# Altium footprint library BARKO_PCBLIB.PcbLib: 531 footprints (part 32 of 34)
Each footprint in its own frame and in the unit in brackets; x right, y up, seen from the top. Pads: shape width x height; smd on the part's side, far side on the other; paste and mask are expansions set on the pad; w line width, h text height; cw(c..) or ccw(c..) is an arc to the next point about the centre after c.
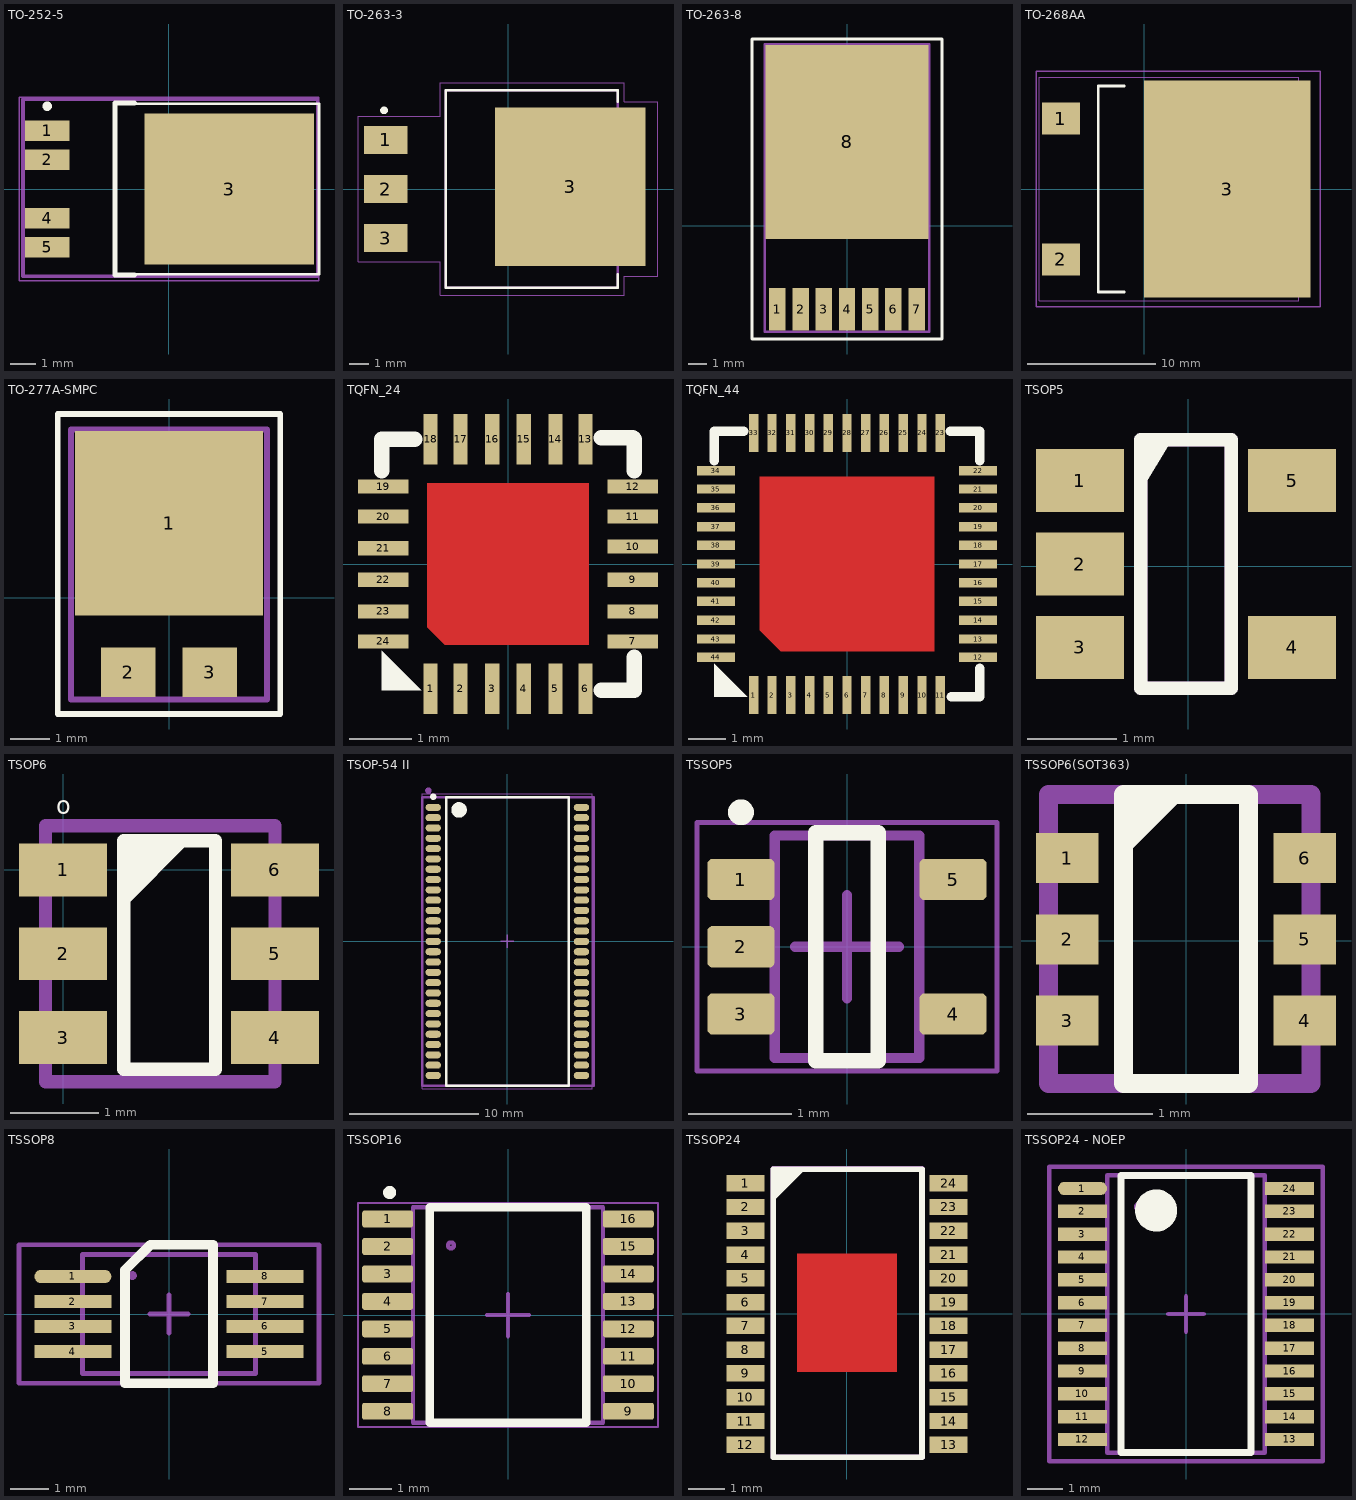
[diagram p31: the footprints below, top view; thin cyan lines are the x and y axes]

## TO-252-5 [mm] "DPAK, 5-Leads, Body 6.5x6.12mm, Pitch 1.14mm, IPC Medium Density"
height 2.35
pads (5):
  rect 1.75x0.8 smd: 1(-4.75,2.28) 2(-4.75,1.14) 4(-4.75,-1.14) 5(-4.75,-2.28)
  rect 6.6x5.9 smd: 3(2.35,0)
Top Overlay:
  circle w0.25: c-4.75,3.23 r0.058
  lines w0.1: -2.1,-3.325 5.85,-3.325 5.85,3.325 -2.1,3.325 -2.1,-3.325
  lines w0.2: -1.35,-3.35 -2.1,-3.35 -2.1,3.35 -1.35,3.35
Mechanical 15:
  lines w0.05: -5.85,-3.575 5.85,-3.575 5.85,3.575 -5.85,3.575 -5.85,-3.575
  lines w0.1: -0.5,0 0.5,0 ; 0,-0.5 0,0.5
ASM Top:
  lines w0.15: -5.7,-3.4 -5.7,3.5 5.8,3.5 5.8,-3.4 -5.7,-3.4
  text ".designator" at -0.6,-0.1 h1.2
3D body "User Library-PG-TO252-5-11-1.STEP": height 2.3, standoff 0, extent -4.8,-3.25 5.1,3.25

## TO-263-3 [mm]
pads (4):
  rect 2.25x1.44 smd: 1(-6.31,2.54) 2(-6.31,0) 3(-6.31,-2.54)
  rect 7.79x8.19 smd paste-10: 3(3.213,0.127)
Top Overlay:
  circle w0.2: c-6.402,4.064 r0.1
  lines w0.127: 5.664,-4.4 5.664,-5.112 -3.226,-5.112 -3.226,5.112 5.664,5.112 5.664,4.5
Top Paste:
  rectangle: 4.8,-3.825 6.8,-1.35
  rectangle: 2.262,-3.825 4.262,-1.35
  rectangle: -0.275,-3.825 1.725,-1.35
  rectangle: 4.8,-1.088 6.8,1.387
  rectangle: 2.262,-1.088 4.262,1.387
  rectangle: -0.275,-1.088 1.725,1.387
  rectangle: 4.8,1.65 6.8,4.125
  rectangle: 2.262,1.65 4.262,4.125
  rectangle: -0.275,1.65 1.725,4.125
Mechanical 15:
  lines w0.05: -7.75,-3.75 -3.5,-3.75 -3.5,-5.5 6,-5.5 6,-4.5 7.75,-4.5 7.75,4.5 6,4.5 6,5.5 -3.5,5.5 -3.5,3.75 -7.75,3.75 -7.75,-3.75
ASM Top:
  lines w0.127: -3.226,-5.112 5.664,-5.112 5.664,5.112 -3.226,5.112 -3.226,-5.112
  text ".designator" at -0.175,-0.375 h1.2
3D body "User Library-D²PAK TO-263-3.STEP": height 4.87, standoff 0, extent -7.116,-5.08 7.114,5.08

## TO-263-8 [mm]
pads (8):
  rect 0.9x2.3 smd: 1(-3.81,-4.575) 2(-2.54,-4.575) 3(-1.27,-4.575) 4(0,-4.575) 5(1.27,-4.575) 6(2.54,-4.575) 7(3.81,-4.575)
  rect 8.9x10.6 smd: 8(0,4.575)
Top Overlay:
  lines w0.15: -5.2,-6.2 5.2,-6.2 5.2,10.2 -5.2,10.2 -5.2,10.1 -5.2,-6.2
ASM Top:
  lines w0.15: -4.5,-5.8 -4.5,9.9 4.5,9.9 4.5,-5.8 -4.5,-5.8
  text ".designator" at 0,0 h0.8
3D body "KTW7.step": height 1.77, standoff 0.01, extent -5.207,-4.623 5.207,9.4

## TO-268AA [mm] "D3-PAK, 3-Pads, Body 10.10x11.39mm (max), IPC Medium Density"
height 5.1
pads (3):
  rect 3x2.5 smd: 1(-6.5,5.5) 2(-6.5,-5.5)
  rect 13x17 smd: 3(6.5,0)
Top Overlay:
  lines w0.2: -1.55,-8.05 -3.6,-8.05 -3.6,8.05 -1.55,8.05
Mechanical 15:
  lines w0.05: -8.2,-8.75 12.1,-8.75 12.1,8.75 -8.2,8.75 -8.2,-8.75
  lines w0.1: 1.45,0 2.45,0 ; 1.95,-0.5 1.95,0.5
ASM Top:
  lines w0.1: -8.45,-9.2 13.75,-9.2 13.75,9.2 -8.45,9.2 -8.45,-9.2
  text ".designator" at -1.375,-1.925 h1.2
3D body "User Library-TO545P1905X510_HS-3.step": height 5.1, standoff 0, extent -6.95,-7.901 12.1,8.101

## TO-277A-SMPC [mil]
pads (3):
  rect 189x186 smd: 1(0,75)
  rect 55x50 smd: 2(-41,-75) 3(41,-75)
Top Overlay:
  lines w6: -112,-117 -112,185 112,185 112,-117 -112,-117
ASM Top:
  lines w6: -98.43,-102.36 -98.43,169.29 98.43,169.29 98.43,-102.36 -98.43,-102.36
  text ".designator" at -19.68,0 h31.5
3D body "TO-277A(SMPC).STEP": height 47.24, standoff -0.04, extent -94.01,-97 93,164.81

## TQFN_24 [mil]
pads (24):
  rect 9x32 smd mask+0: 1(-49,-79) 2(-30,-79) 3(-10,-79) 4(10,-79) 5(30,-79) 6(49,-79) 13(49,79) 14(30,79) 15(10,79) 16(-10,79) 17(-30,79) 18(-49,79)
  rect 32x9 smd mask+0: 7(79,-49) 8(79,-30) 9(79,-10) 10(79,11) 11(79,30) 12(79,49) 19(-79,49) 20(-79,30) 21(-79,10) 22(-79,-10) 23(-79,-30) 24(-79,-49)
Top Layer:
  region: 51,51 -51,51 -51,-40 -40,-51 51,-51
Top Overlay:
  region: -80,-55 -80,-80 -55,-80
  lines w10: -80,59 -80,79 -59,79 ; 59,-80 80,-80 80,-59 ; 59,80 79,80 80,79 80,59

## TQFN_44 [mil]
pads (44):
  rect 10x40 smd mask+0: 1(-98,-138) 2(-79,-138) 3(-59,-138) 4(-39,-138) 5(-20,-138) 6(0,-138) 7(20,-138) 8(39,-138) 9(59,-138) 10(79,-138) 11(98,-138) 23(98,138) 24(79,138) 25(59,138) 26(39,138) 27(20,138) 28(0,138) 29(-20,138) 30(-39,138) 31(-59,138) 32(-79,138) 33(-98,138)
  rect 40x10 smd mask+0: 12(138,-98) 13(138,-79) 14(138,-59) 15(138,-39) 16(138,-20) 17(138,0) 18(138,20) 19(138,39) 20(138,59) 21(138,79) 22(138,98) 34(-138,98) 35(-138,79) 36(-138,59) 37(-138,39) 38(-138,20) 39(-138,0) 40(-138,-20) 41(-138,-39) 42(-138,-59) 43(-138,-79) 44(-138,-98)
Top Layer:
  region: 92,92 -92,92 -92,-70 -70,-92 92,-92
Top Overlay:
  region: -140,-105 -140,-140 -105,-140
  lines w10: -140,109 -140,140 -109,140 ; 109,140 140,140 140,109 ; 110,-140 140,-140 140,-110

## TSOP5 [mil]
pads (5):
  rect 39x28 smd mask+2: 1(-47.95,38) 2(-47.95,1) 3(-47.95,-36) 4(46.05,-36) 5(46.05,38)
Top Overlay:
  region: -7.37,56 -20.95,56 -20.95,33.36
  lines w6: -20.95,-54 19.05,-54 19.05,56 -20.95,56 -20.95,-54
ASM Top:
  lines w6: -20.95,-54 -20.95,56 19.05,56 19.05,-54 -20.95,-54
  text ".designator" at -27.56,-11.81 h31.5
3D body "5-TSOP.STEP": height 43.31, standoff 0, extent -59.06,-61.03 59.05,61.02

## TSOP6 [mm]
pads (6):
  rect 1x0.6 smd: 1(0,0) 2(0,-0.95) 3(0,-1.9) 4(2.4,-1.9) 5(2.4,-0.95) 6(2.4,0)
Top Overlay:
  region: 0.686,0.33 0.686,-0.432 1.448,0.33
  lines w0.152: 0.686,-2.261 1.727,-2.261 1.727,0.33 0.686,0.33 0.686,-2.261
  text "o" at -0.076,0.635 h0.2
ASM Top:
  lines w0.15: -0.2,-2.4 2.4,-2.4 2.4,0.5 -0.2,0.5 -0.2,-2.4
  text ".designator" at 0.8,-0.8 h1.5
3D body "TSOP6.STEP": height 1.01, standoff -0.04, extent -0.232,-2.465 2.518,0.535

## TSOP-54 II [mm] "TSOP, 54-Leads, Body 22.22x10.16mm, Pitch 0.80mm, IPC Medium Density"
height 1.2
pads (54):
  oval 1.2x0.55 smd mask+0.05: 1(-5.75,10.4) 2(-5.75,9.6) 3(-5.75,8.8) 4(-5.75,8) 5(-5.75,7.2) 6(-5.75,6.4) 7(-5.75,5.6) 8(-5.75,4.8) 9(-5.75,4) 10(-5.75,3.2) 11(-5.75,2.4) 12(-5.75,1.6) 13(-5.75,0.8) 14(-5.75,0) 15(-5.75,-0.8) 16(-5.75,-1.6) 17(-5.75,-2.4) 18(-5.75,-3.2) 19(-5.75,-4) 20(-5.75,-4.8) 21(-5.75,-5.6) 22(-5.75,-6.4) 23(-5.75,-7.2) 24(-5.75,-8) 25(-5.75,-8.8) 26(-5.75,-9.6) 27(-5.75,-10.4) 28(5.75,-10.4) 29(5.75,-9.6) 30(5.75,-8.8) 31(5.75,-8) 32(5.75,-7.2) 33(5.75,-6.4) 34(5.75,-5.6) 35(5.75,-4.8) 36(5.75,-4) 37(5.75,-3.2) 38(5.75,-2.4) 39(5.75,-1.6) 40(5.75,-0.8) 41(5.75,0) 42(5.75,0.8) 43(5.75,1.6) 44(5.75,2.4) 45(5.75,3.2) 46(5.75,4) 47(5.75,4.8) 48(5.75,5.6) 49(5.75,6.4) 50(5.75,7.2) 51(5.75,8) 52(5.75,8.8) 53(5.75,9.6) 54(5.75,10.4)
Top Overlay:
  circle w0.6: c-3.75,10.2 r0.3
  circle w0.25: c-5.75,11.225 r0.125
  lines w0.2: -4.75,-11.2 4.75,-11.2 4.75,11.2 -4.75,11.2 -4.75,-11.2
Mechanical 15:
  lines w0.05: -6.6,-11.45 6.6,-11.45 6.6,11.45 -6.6,11.45 -6.6,-11.45
  lines w0.1: -0.5,0 0.5,0 ; 0,-0.5 0,0.5
ASM Top:
  circle w0.25: c-6.125,11.7 r0.125
  circle w0.2: c-3.75,10.2 r0.112
  lines w0.2: -6.6,-11.2 -6.6,11.2 6.7,11.2 6.7,-11.2 -6.6,-11.2
  text ".designator" at 0,0 h0.8
3D body "User Library-TSOP-54-1.step": height 1.25, standoff 0, extent -5.88,-11.11 5.88,11.11

## TSSOP5 [mm] "SOT23, 5-Leads, Body 2.15x1.4mm, Pitch 0.65mm, IPC High Density"
height 1.1
pads (5):
  rrect25% 0.65x0.4 smd mask+0.051: 1(-1.025,0.65) 2(-1.025,0) 3(-1.025,-0.65) 4(1.025,-0.65) 5(1.025,0.65)
Top Overlay:
  circle w0.15: c-1.025,1.3 r0.05
  lines w0.15: -0.3,-1.1 -0.3,1.1 0.3,1.1 0.3,-1.1 -0.3,-1.1
Mechanical 15:
  lines w0.05: -1.45,-1.2 1.45,-1.2 1.45,1.2 -1.45,1.2 -1.45,-1.2
  lines w0.1: -0.5,0 0.5,0 ; 0,-0.5 0,0.5
ASM Top:
  lines w0.1: -0.7,-1.075 -0.7,1.075 0.7,1.075 0.7,-1.075 -0.7,-1.075
  text ".designator" at -0.4,-0.1 h0.8
3D body "DCK0005AakaMAA05A.stp": height 0.94, standoff -0.01, extent -1.14,-1 1.14,1

## TSSOP6(SOT363) [mm]
pads (6):
  rect 0.5x0.4 smd mask+0.05: 1(-0.95,0.659) 2(-0.95,0.009) 3(-0.95,-0.641) 4(0.95,-0.641) 5(0.95,0.009) 6(0.95,0.659)
Top Overlay:
  region: -0.465,1.168 -0.465,0.7 0.003,1.168
  lines w0.152: -0.5,-1.143 -0.5,1.168 0.5,1.168 0.5,-1.143 -0.5,-1.143
ASM Top:
  lines w0.15: -1.1,-1.143 1,-1.143 1,1.168 -1.1,1.168 -1.1,-1.143
  text ".designator" at -0.051,-0.457 h0.8
3D body "TSSOP6.STEP": height 1.11, standoff 0.01, extent -1.1,-0.991 1.1,1.009

## TSSOP8 [mm]
height 1.2
pads (8):
  oval 2x0.35 smd: 1(-2.5,0.975)
  rect 2x0.35 smd: 2(-2.5,0.325) 3(-2.5,-0.325) 4(-2.5,-0.975) 5(2.5,-0.975) 6(2.5,-0.325) 7(2.5,0.325) 8(2.5,0.975)
Top Overlay:
  lines w0.254: -1.143,-1.8 -1.143,1.143 -0.486,1.8 1.143,1.8 1.143,-1.8 -1.143,-1.8
Mechanical 15:
  lines w0.127: -0.5,0 0.5,0 ; 0,-0.5 0,0.5 ; -3.9,-1.8 3.9,-1.8 3.9,1.8 -3.9,1.8 -3.9,-1.8
ASM Top:
  circle w0.127: c-0.95,1 r0.05
  lines w0.127: -1.55,-1.55 1.55,-1.55 ; -1.55,1.55 1.55,1.55 ; -2.25,-1.55 -2.25,1.55 2.25,1.55 2.25,-1.55 -2.25,-1.55
  text ".designator" at -0.5,-0.2 h0.8
3D body "TSSOP8.step": height 1.2, standoff 0, extent -3.2,-1.55 3.2,1.55

## TSSOP16 [mm]
pads (16):
  rrect25% 1.2x0.4 smd mask+0.05: 1(-2.85,2.275) 2(-2.85,1.625) 3(-2.85,0.975) 4(-2.85,0.325) 5(-2.85,-0.325) 6(-2.85,-0.975) 7(-2.85,-1.625) 8(-2.85,-2.275) 9(2.85,-2.275) 10(2.85,-1.625) 11(2.85,-0.975) 12(2.85,-0.325) 13(2.85,0.325) 14(2.85,0.975) 15(2.85,1.625) 16(2.85,2.275)
Top Overlay:
  lines w0.2: -1.85,-2.55 1.85,-2.55 1.85,2.55 -1.85,2.55 -1.85,-2.55
  lines w0.254: -2.783,2.921 ccw(c-2.8,2.9) -2.773,2.901
Mechanical 15:
  lines w0.05: -3.55,-2.65 3.55,-2.65 3.55,2.65 -3.55,2.65 -3.55,-2.65
  lines w0.1: -0.5,0 0.5,0 ; 0,-0.5 0,0.5
ASM Top:
  circle w0.1: c-1.35,1.65 r0.071
  lines w0.1: -2.25,-2.55 -2.25,2.55 2.25,2.55 2.25,-2.55 -2.25,-2.55
  text ".designator" at -0.496,0 h0.8
3D body "PW0016AakaMTC16.stp": height 1, standoff 0, extent -3.21,-2.5 3.21,2.5
3D body "TSSOP-16-2.STEP": height 1.21, standoff 0.01, extent -3.205,-2.5 3.195,2.5

## TSSOP24 [mm]
pads (24):
  rect 1.05x0.45 smd mask+0.051: 1(-2.775,3.575) 2(-2.775,2.925) 3(-2.775,2.275) 4(-2.775,1.625) 5(-2.775,0.975) 6(-2.775,0.325) 7(-2.775,-0.325) 8(-2.775,-0.975) 9(-2.775,-1.625) 10(-2.775,-2.275) 11(-2.775,-2.925) 12(-2.775,-3.575) 13(2.775,-3.575) 14(2.775,-2.925) 15(2.775,-2.275) 16(2.775,-1.625) 17(2.775,-0.975) 18(2.775,-0.325) 19(2.775,0.325) 20(2.775,0.975) 21(2.775,1.625) 22(2.775,2.275) 23(2.775,2.925) 24(2.775,3.575)
Top Layer:
  region: 1.359,1.651 1.359,-1.575 -1.359,-1.575 -1.359,1.651
Top Overlay:
  region: -1.14,3.96 -2.013,3.956 -2.013,3.087
  lines w0.152: -2.013,-3.918 -2.013,3.956 2.051,3.956 2.051,-3.918 -2.013,-3.918
ASM Top:
  lines w0.152: -2.013,-3.912 2.051,-3.912 2.051,3.962 -2.013,3.962 -2.013,-3.912
  text ".designator" at -0.1,1.4 h0.8
3D body "TSSOP-24.STEP": height 1.21, standoff 0.01, extent -3.175,-3.912 3.225,3.888

## TSSOP24 - NOEP [mm]
height 1.1
pads (24):
  oval 1.397x0.381 smd: 1(-2.95,3.575)
  rect 1.397x0.381 smd: 2(-2.95,2.925) 3(-2.95,2.275) 4(-2.95,1.625) 5(-2.95,0.975) 6(-2.95,0.325) 7(-2.95,-0.325) 8(-2.95,-0.975) 9(-2.95,-1.625) 10(-2.95,-2.275) 11(-2.95,-2.925) 12(-2.95,-3.575) 13(2.95,-3.575) 14(2.95,-2.925) 15(2.95,-2.275) 16(2.95,-1.625) 17(2.95,-0.975) 18(2.95,-0.325) 19(2.95,0.325) 20(2.95,0.975) 21(2.95,1.625) 22(2.95,2.275) 23(2.95,2.925) 24(2.95,3.575)
Top Overlay:
  circle w0.6: c-0.85,2.95 r0.3
  lines w0.2: -1.85,-3.95 -1.85,3.95 1.85,3.95 1.85,-3.95 -1.85,-3.95
Mechanical 15:
  lines w0.127: -0.5,0 0.5,0 ; 0,-0.5 0,0.5 ; -3.9,-4.2 -3.9,4.2 3.9,4.2 3.9,-4.2 -3.9,-4.2
ASM Top:
  circle w0.127: c-1.35,3.05 r0.071
  lines w0.127: -2.25,-3.95 2.25,-3.95 2.25,3.95 -2.25,3.95 -2.25,-3.95
  text ".designator" at -0.8,-0.3 h0.8
3D body "TSSOP24.step": height 1.1, standoff 0, extent -3.2,-3.95 3.2,3.95